# Altium footprint library Apalis Evaluation Board.PcbLib: 212 footprints (part 7 of 14)
Each footprint in its own frame and in the unit in brackets; x right, y up, seen from the top. Pads: shape width x height; smd on the part's side, far side on the other; paste and mask are expansions set on the pad; w line width, h text height; cw(c..) or ccw(c..) is an arc to the next point about the centre after c.
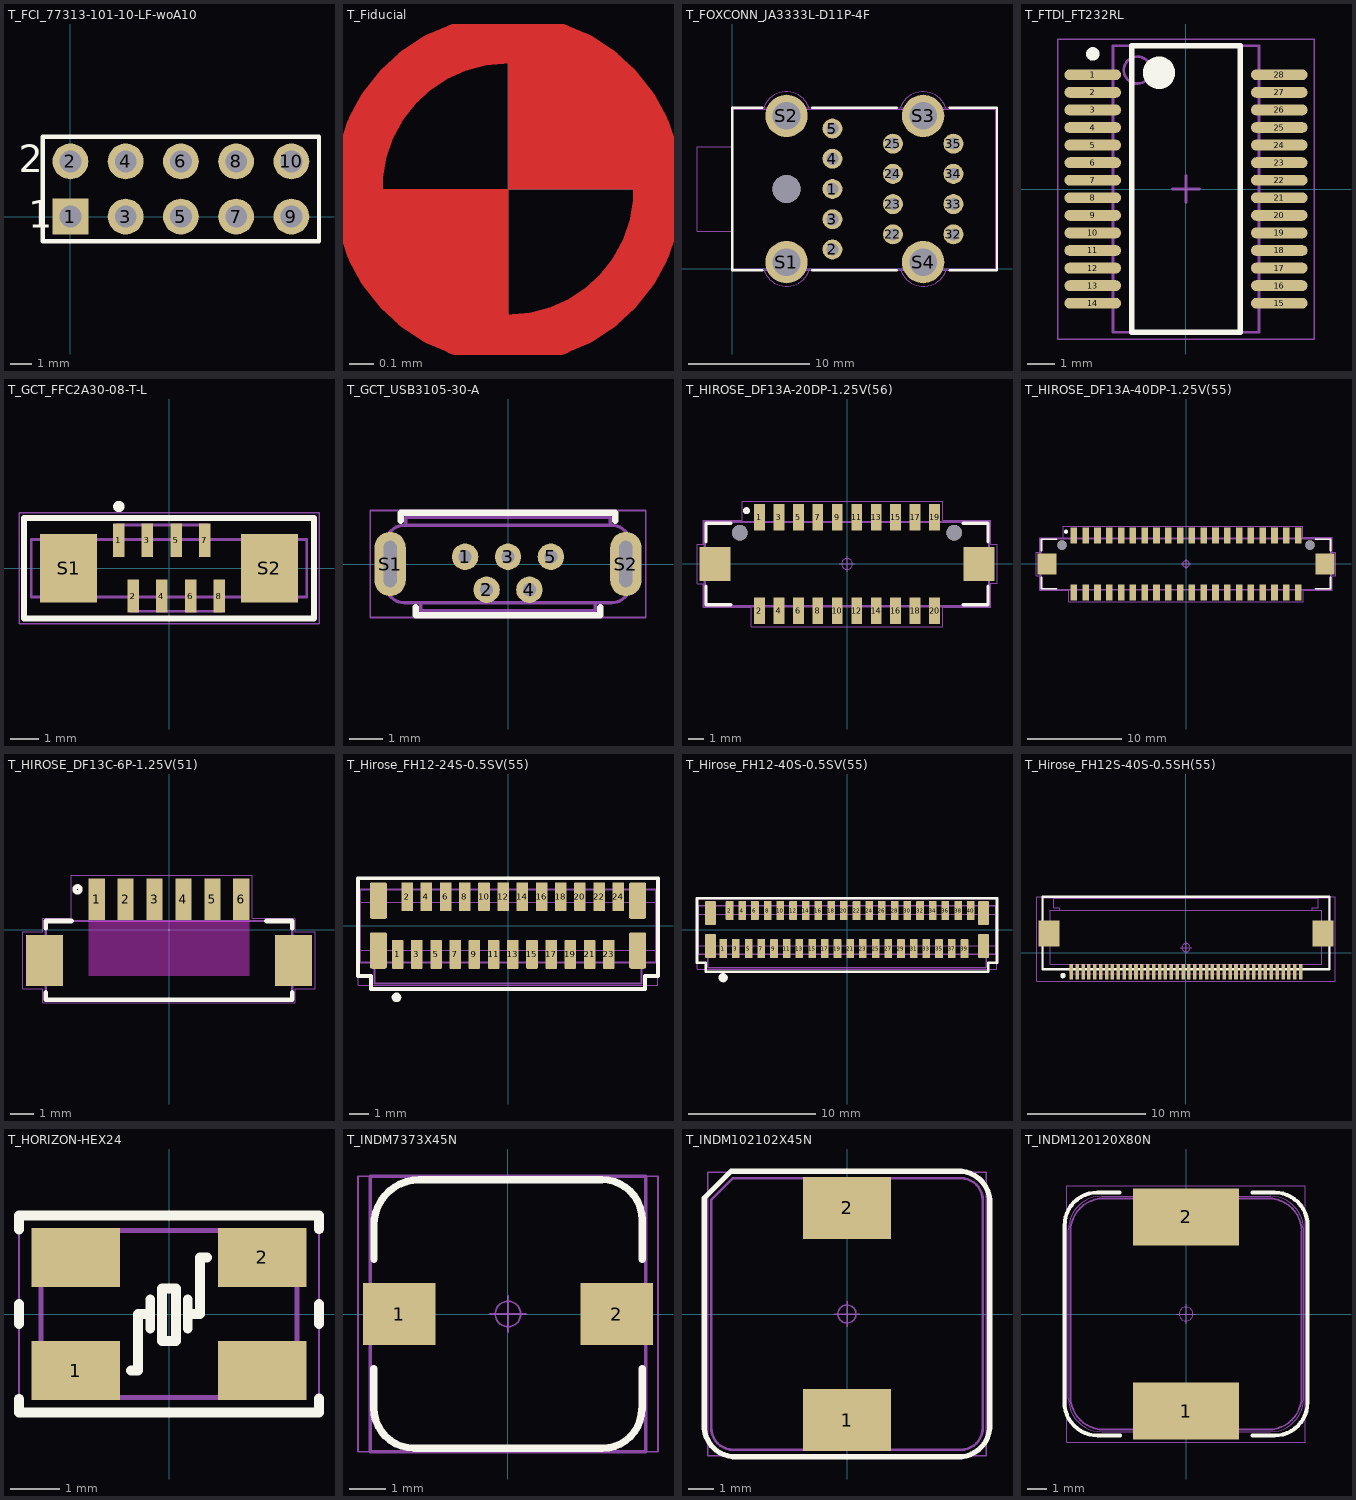
[diagram p6: the footprints below, top view; thin cyan lines are the x and y axes]

## T_FCI_77313-101-10-LF-woA10 [mm] "2.54 mm header"
height 10.8
pads (10):
  rect 1.65x1.65 hole 1: 1(0,0)
  round 1.65 hole 1: 2(0,2.54) 3(2.54,0) 4(2.54,2.54) 5(5.08,0) 6(5.08,2.54) 7(7.62,0) 8(7.62,2.54) 9(10.16,0) 10(10.16,2.54)
Top Overlay:
  lines w0.2: -1.27,-1.14 11.43,-1.14 ; -1.27,-1.137 -1.27,3.68 11.43,3.68 11.43,-1.137
  text "2" at -2.364,2.048 h1.27
  text "1" at -1.941,-0.522 h1.27
Mechanical 1:
  lines w0.05: -1.27,-1.14 11.43,-1.14 ; -1.27,-1.137 -1.27,3.68 11.43,3.68 11.43,-1.137
Mechanical 2:
  lines w0.001: -1.27,-1.14 11.43,-1.14 11.43,3.68 -1.27,3.68 -1.27,-1.14
Mechanical 3:
  lines w0.1: -1.27,-1.14 11.43,-1.14 ; -1.27,-1.137 -1.27,3.68 11.43,3.68 11.43,-1.137

## T_Fiducial [mm] "Fiducial"
Top Layer:
  region: 0,-0.625 -0.375,-0.5 -0.625,-0.25 -0.625,0 0,0
  region: 0.625,0 0,0 0,0.625 0.375,0.5 0.625,0.25
  lines w0.203: 0,-0.625 ccw(c0,0) 0,0.625 ccw(c0,0) 0,-0.625
Top Solder:
  circle w0.203: c0,0 r0.625
  region: 0.625,0 0.5,-0.375 0.25,-0.625 -0.25,-0.625 -0.5,-0.375 -0.625,0 -0.5,0.375 -0.375,0.5 0,0.625 0.375,0.5 0.5,0.25 0.5,0.375 0.375,0.5

## T_FOXCONN_JA3333L-D11P-4F [mm] "Audio Jack Triple Stacked DIP Type With Sense"
height 35.5
pads (18):
  round 1.65 hole 1: 1(8.3,6.6) 2(8.3,1.6) 3(8.3,4.1) 4(8.3,9.1) 5(8.3,11.6) 22(13.3,2.85) 23(13.3,5.35) 24(13.3,7.85) 25(13.3,10.35) 32(18.3,2.85) 33(18.3,5.35) 34(18.3,7.85) 35(18.3,10.35)
  round 3.5 hole 2.3: S1(4.5,0.55) S2(4.5,12.65) S3(15.8,12.65) S4(15.8,0.55)
  round 2.3 hole 2.3 unplated: ""(4.5,6.6)
Top Overlay:
  lines w0.2: 0,-0.105 2.5,-0.105 ; 0,-0.082 0,13.305 2.5,13.305 ; 6.625,-0.105 13.625,-0.105 ; 6.625,13.305 13.625,13.305 ; 18,-0.105 21.903,-0.105 21.905,-0.105 21.905,13.305 18,13.305
Mechanical 1:
  lines w0.05: 2.604,13.299 cw(c4.484,12.666) 6.363,13.301 ; 2.604,13.3 0,13.3 0,-0.1 2.637,-0.1 ; 2.637,-0.101 ccw(c4.516,0.533) 6.396,-0.099 ; 6.363,13.3 13.904,13.3 ; 6.396,-0.1 13.937,-0.1 ; 13.904,13.299 cw(c15.784,12.666) 17.663,13.301 ; 13.937,-0.101 ccw(c15.816,0.533) 17.696,-0.099 ; 17.663,13.3 21.9,13.3 21.9,-0.1 17.696,-0.1
Mechanical 2:
  lines w0.001: 0,3.1 -2.9,3.1 -2.9,10.1 0,10.1 ; 0,0 0,13.2 21.8,13.2 21.8,0 0,0
Mechanical 3:
  lines w0.1: 0,-0.1 21.901,-0.1 ; 0,13.3 21.9,13.3 21.902,13.298 21.902,-0.1 ; 0.001,-0.074 0.001,13.326 ; 21.901,-0.1 21.902,-0.1
3D body: height 31.5, standoff 28.5, extent -2.905,5.105 0.01,8.093
3D body: height 19, standoff 16, extent -2.905,5.105 0.01,8.093
3D body: height 6.5, standoff 3.5, extent -2.905,5.105 0.01,8.093
3D body: height 21.01, standoff 13.99, extent -2.9,3.1 0,10.1
3D body: height 33.51, standoff 26.49, extent -2.9,3.1 0,10.1
3D body: height 8.51, standoff 1.49, extent -2.9,3.1 0,10.1
3D body: height 38.5, standoff 0, extent 0,0 21.8,13.2

## T_FTDI_FT232RL [mm] "28-Pin SSOP 0.65 mm Pitch"
height 2
pads (28):
  oval 2.1x0.4 smd: 1(-3.45,4.225) 2(-3.45,3.575) 3(-3.45,2.925) 4(-3.45,2.275) 5(-3.45,1.625) 6(-3.45,0.975) 7(-3.45,0.325) 8(-3.45,-0.325) 9(-3.45,-0.975) 10(-3.45,-1.625) 11(-3.45,-2.275) 12(-3.45,-2.925) 13(-3.45,-3.575) 14(-3.45,-4.225) 15(3.45,-4.225) 16(3.45,-3.575) 17(3.45,-2.925) 18(3.45,-2.275) 19(3.45,-1.625) 20(3.45,-0.975) 21(3.45,-0.325) 22(3.45,0.325) 23(3.45,0.975) 24(3.45,1.625) 25(3.45,2.275) 26(3.45,2.925) 27(3.45,3.575) 28(3.45,4.225)
Top Overlay:
  circle w0.6: c-1,4.3 r0.3
  circle w0.25: c-3.45,5 r0.125
  lines w0.2: -2,-5.3 2,-5.3 2,5.3 -2,5.3 -2,-5.3
Mechanical 1:
  lines w0.05: -4.75,-5.55 -4.75,5.55 4.75,5.55 4.75,-5.55 -4.75,-5.55
  lines w0.1: -0.5,0 0.5,0 ; 0,-0.5 0,0.5
Mechanical 2:
  lines w0.001: -2.7,-5.3 2.7,-5.3 2.7,5.3 -2.7,5.3 -2.7,-5.3
Mechanical 3:
  circle w0.1: c-1.8,4.4 r0.5
  lines w0.1: -2.7,-5.3 -2.7,5.3 2.7,5.3 2.7,-5.3 -2.7,-5.3
3D body: height 2, standoff 0, extent -2.7,-5.3 2.7,5.3

## T_GCT_FFC2A30-08-T-L [mm] "JTAG FFC Connector 0.5mm pitch vertical"
height 5.4
pads (10):
  rect 0.4x1.15 smd: 1(-1.75,0.975) 2(-1.25,-0.975) 3(-0.75,0.975) 4(-0.25,-0.975) 5(0.25,0.975) 6(0.75,-0.975) 7(1.25,0.975) 8(1.75,-0.975)
  rect 2x2.4 smd: S1(-3.5,0) S2(3.5,0)
Top Overlay:
  circle w0.254: c-1.75,2.15 r0.071
  lines w0.2: -5.05,-1.75 -5.05,1.75 5.05,1.75 5.05,-1.75 -5.05,-1.75
Mechanical 1:
  lines w0.05: -5.225,-1.925 -5.225,1.925 5.225,1.925 5.225,-1.925 -5.225,-1.925
Mechanical 2:
  lines w0.001: -4.25,-1 -4.25,1 ; -1.85,1 -1.85,1.5 1.35,1.5 1.35,1 ; -1.35,-1 -1.35,-1.5 1.85,-1.5 1.85,-1 ; 4.25,-1 4.25,1 ; -4.8,-1 -4.8,1 4.8,1 4.8,-1 -4.8,-1
Mechanical 3:
  lines w0.1: -1.85,1 -1.85,1.5 1.35,1.5 1.35,1 ; -1.35,-1 -1.35,-1.5 1.85,-1.5 1.85,-1 ; -4.8,-1 4.8,-1 4.8,1 -4.8,1 -4.8,-1
3D body: height 4.4, standoff 2.5, extent -4.8,-1 4.8,1
3D body: height 2.5, standoff 0, extent -4.25,-1 4.25,1

## T_GCT_USB3105-30-A [mm] "Micro USB Connector Vertical"
height 5.6
pads (7):
  round 0.8 hole 0.4: 1(-1.3,0.22) 2(-0.65,-0.78) 3(0,0.22) 4(0.65,-0.78) 5(1.3,0.22)
  oval 0.95x1.95 hole 0.4 slot 1.4 at 90 deg: S1(-3.575,0) S2(3.575,0)
Top Overlay:
  lines w0.2: -3.25,1.32 -3.25,1.55 3.25,1.55 3.25,1.32 ; -2.8,-1.32 -2.8,-1.55 2.8,-1.55 2.8,-1.32
Mechanical 1:
  lines w0.05: -4.175,-1.625 -4.175,1.625 4.175,1.625 4.175,-1.625 -4.175,-1.625
Mechanical 2:
  lines w0.001: -3.7,-0.175 -3.945,-0.175 -3.945,0.625 -3.7,0.625 ; -3.1,1.175 -3.1,1.42 3.1,1.42 3.1,1.175 ; -2.65,-1.175 -2.65,-1.42 2.65,-1.42 2.65,-1.175 ; 3.15,1.175 cw(c3.15,0.625) 3.7,0.625 ; 3.175,1.175 -3.15,1.175 ccw(c-3.15,0.625) -3.7,0.625 ; 3.7,-0.175 3.945,-0.175 3.945,0.625 3.7,0.625 ; -3.7,0.625 -3.7,-0.625 ccw(c-3.15,-0.625) -3.15,-1.175 3.15,-1.175 ccw(c3.15,-0.625) 3.7,-0.625 3.7,0.625
Mechanical 3:
  lines w0.1: -3.7,-0.175 -3.945,-0.175 -3.945,0.625 -3.7,0.625 ; -3.1,1.175 -3.1,1.42 3.1,1.42 3.1,1.175 ; -2.65,-1.175 -2.65,-1.42 2.65,-1.42 2.65,-1.175 ; 3.15,1.175 cw(c3.15,0.625) 3.7,0.625 ; 3.175,1.175 -3.15,1.175 ccw(c-3.15,0.625) -3.7,0.625 ; 3.7,-0.175 3.945,-0.175 3.945,0.625 3.7,0.625 ; -3.7,0.625 -3.7,-0.625 ccw(c-3.15,-0.625) -3.15,-1.175 3.15,-1.175 ccw(c3.15,-0.625) 3.7,-0.625 3.7,0.625
3D body "USB3105.STEP": height 5.62, standoff -1.48, extent -3.98,-1.455 3.98,1.48

## T_HIROSE_DF13A-20DP-1.25V(56) [mm]
height 4.8
pads (24):
  rect 0.7x1.7 smd: 1(-5.625,3) 2(-5.625,-3) 3(-4.375,3) 4(-4.375,-3) 5(-3.125,3) 6(-3.125,-3) 7(-1.875,3) 8(-1.875,-3) 9(-0.625,3) 10(-0.625,-3) 11(0.625,3) 12(0.625,-3) 13(1.875,3) 14(1.875,-3) 15(3.125,3) 16(3.125,-3) 17(4.375,3) 18(4.375,-3) 19(5.625,3) 20(5.625,-3)
  rect 2x2.2 smd: ""(-8.475,0) ""(8.475,0)
  round 1 hole 1 unplated paste+0 mask+0: ""(-6.875,2) ""(6.875,2)
Top Overlay:
  circle w0.2: c-6.455,3.42 r0.125
  lines w0.2: -9.04,-1.42 -9.04,-2.62 -7.463,-2.62 ; -9.04,1.41 -9.04,2.61 -7.463,2.61 ; 7.463,-2.62 9.04,-2.62 9.04,-1.42 ; 7.463,2.61 9.04,2.61 9.04,1.41
Mechanical 1:
  circle w0.05: c0,0 r0.35
  lines w0.05: -0.5,0 0.5,0 ; 0,-0.5 0,0.5 ; 9.222,1.255 9.222,2.804 8.052,2.804 6.136,2.804 6.136,4.01 -6.726,4.01 -6.726,2.796 -9.216,2.796 -9.216,1.652 -9.216,1.252 -9.63,1.252 -9.63,-1.258 -9.218,-1.258 -9.218,-2.796 -6.142,-2.796 -6.142,-4.02 6.143,-4.02 6.143,-2.796 9.221,-2.796 9.221,-1.248 9.63,-1.248 ; 9.224,1.255 9.63,1.255 9.63,-1.237
Mechanical 2:
  lines w0.001: -9.175,-2.75 -9.175,2.75 9.175,2.75 9.175,-2.75 -9.175,-2.75
Mechanical 3:
  lines w0.1: -9.1,-2.68 -9.1,2.67 9.1,2.67 9.1,-2.68 -9.1,-2.68
3D body "DF13A-20DP-1.25V.stp": height 4.8, standoff 0, extent -9.175,-3.45 9.175,3.45

## T_HIROSE_DF13A-40DP-1.25V(55) [mm]
height 4.8
pads (44):
  rect 0.7x1.7 smd: 1(-11.875,3) 2(-11.875,-3) 3(-10.625,3) 4(-10.625,-3) 5(-9.375,3) 6(-9.375,-3) 7(-8.125,3) 8(-8.125,-3) 9(-6.875,3) 10(-6.875,-3) 11(-5.625,3) 12(-5.625,-3) 13(-4.375,3) 14(-4.375,-3) 15(-3.125,3) 16(-3.125,-3) 17(-1.875,3) 18(-1.875,-3) 19(-0.625,3) 20(-0.625,-3) 21(0.625,3) 22(0.625,-3) 23(1.875,3) 24(1.875,-3) 25(3.125,3) 26(3.125,-3) 27(4.375,3) 28(4.375,-3) 29(5.625,3) 30(5.625,-3) 31(6.875,3) 32(6.875,-3) 33(8.125,3) 34(8.125,-3) 35(9.375,3) 36(9.375,-3) 37(10.625,3) 38(10.625,-3) 39(11.875,3) 40(11.875,-3)
  rect 2x2.2 smd: ""(-14.725,0) ""(14.725,0)
  round 1 hole 1 unplated paste+0 mask+0: ""(-13.125,2) ""(13.125,2)
Top Overlay:
  circle w0.2: c-12.705,3.42 r0.125
  lines w0.2: -15.29,-1.42 -15.29,-2.62 -13.713,-2.62 ; -15.29,1.41 -15.29,2.61 -13.713,2.61 ; 13.713,-2.62 15.29,-2.62 15.29,-1.42 ; 13.713,2.61 15.29,2.61 15.29,1.41
Mechanical 1:
  circle w0.05: c0,0 r0.35
  lines w0.05: -0.5,0 0.5,0 ; 0,-0.5 0,0.5 ; 15.472,1.255 15.472,2.804 14.302,2.804 12.386,2.804 12.386,4.01 -12.976,4.01 -12.976,2.796 -15.466,2.796 -15.466,1.652 -15.466,1.252 -15.88,1.252 -15.88,-1.258 -15.468,-1.258 -15.468,-2.796 -12.392,-2.796 -12.392,-4.02 12.393,-4.02 12.393,-2.796 15.471,-2.796 15.471,-1.248 15.88,-1.248 ; 15.474,1.255 15.88,1.255 15.88,-1.237
Mechanical 2:
  lines w0.001: -15.425,-2.75 -15.425,2.75 15.425,2.75 15.425,-2.75 -15.425,-2.75
Mechanical 3:
  lines w0.1: -15.35,-2.68 -15.35,2.67 15.35,2.67 15.35,-2.68 -15.35,-2.68
3D body "DF13A-40DP-1.25V.stp": height 4.82, standoff 0.02, extent -15.425,-3.45 15.425,3.45

## T_HIROSE_DF13C-6P-1.25V(51) [mm] "Touch connector"
height 4.8
pads (8):
  rect 0.7x1.8 smd: 1(-3.125,1.324) 2(-1.875,1.324) 3(-0.625,1.324) 4(0.625,1.324) 5(1.875,1.324) 6(3.125,1.324)
  rect 1.6x2.2 smd: ""(-5.385,-1.324) ""(5.385,-1.324)
Top Overlay:
  circle w0.2: c-3.955,1.744 r0.125
  lines w0.2: -5.325,-2.713 -5.325,-3.024 5.325,-3.024 5.325,-2.713 ; -5.325,0.064 -5.325,0.376 -4.201,0.376 ; 4.201,0.376 5.325,0.376 5.325,0.064
Keep-Out Layer:
  rectangle: -3.475,-1.994 3.475,0.376
Mechanical 1:
  lines w0.05: -6.316,-2.555 -6.316,-0.093 -5.456,-0.093 -5.456,0.506 -4.226,0.506 -4.226,2.354 3.606,2.354 3.606,0.507 5.456,0.507 5.456,-0.092 6.316,-0.093 6.316,-2.555 5.456,-2.555 5.456,-3.155 -5.456,-3.155 -5.456,-2.555 -6.316,-2.555
Mechanical 2:
  lines w0.001: -5.325,-2.224 -6.075,-2.224 -6.075,-0.424 -5.325,-0.424 ; 5.325,-2.224 6.075,-2.224 6.075,-0.424 5.325,-0.424 ; -5.325,-3.024 -5.325,0.376 5.325,0.376 5.325,-3.024 -5.325,-3.024
Mechanical 3:
  lines w0.1: -5.325,-3.024 -5.325,0.376 5.325,0.376 5.325,-3.024 -5.325,-3.024

## T_Hirose_FH12-24S-0.5SV(55) [mm] "FFC Connector 0.5mm pitch Vertical"
height 5.5
pads (28):
  rrect12% 0.6x1.5 smd: 1(-5.75,-1.5) 2(-5.25,1.5) 3(-4.75,-1.5) 4(-4.25,1.5) 5(-3.75,-1.5) 6(-3.25,1.5) 7(-2.75,-1.5) 8(-2.25,1.5) 9(-1.75,-1.5) 10(-1.25,1.5) 11(-0.75,-1.5) 12(-0.25,1.5) 13(0.25,-1.5) 14(0.75,1.5) 15(1.25,-1.5) 16(1.75,1.5) 17(2.25,-1.5) 18(2.75,1.5) 19(3.25,-1.5) 20(3.75,1.5) 21(4.25,-1.5) 22(4.75,1.5) 23(5.25,-1.5) 24(5.75,1.5)
  rrect25% 0.9x1.9 smd: ""(-6.75,-1.3) ""(-6.75,1.3) ""(6.75,-1.3) ""(6.75,1.3)
Top Overlay:
  circle w0.25: c-5.81,-3.738 r0.125
  lines w0.2: -7.814,-2.625 -7.814,2.464 7.814,2.464 7.814,-2.625 7.132,-2.625 7.132,-3.307 -7.132,-3.307 -7.132,-2.625 -7.814,-2.625
Mechanical 1:
  lines w0.05: -7.8,-3.116 7.8,-3.116 7.8,2.416 -7.8,2.416 -7.8,-3.116
Mechanical 2:
  lines w0.001: -7.7,-1.275 7.7,-1.275 ; -7.7,1.225 7.7,1.225 ; -6.95,-1.925 -6.95,-3.025 6.95,-3.025 6.95,-1.925 ; -7.7,-1.925 7.7,-1.925 7.7,1.875 -7.7,1.875 -7.7,-1.925
Mechanical 3:
  lines w0.1: -6.95,-1.925 -6.95,-3.025 6.95,-3.025 6.95,-1.925 ; -7.7,-1.925 7.7,-1.925 7.7,1.875 -7.7,1.875 -7.7,-1.925
3D body "FH12-24S-0.5SV.stp": height 5.52, standoff 0.02, extent -7.7,-1.925 7.7,1.875

## T_Hirose_FH12-40S-0.5SV(55) [mm] "FFC Connector 0.5mm pitch Vertical"
height 5.5
pads (44):
  rrect12% 0.6x1.5 smd: 1(-9.75,-1.5) 2(-9.25,1.5) 3(-8.75,-1.5) 4(-8.25,1.5) 5(-7.75,-1.5) 6(-7.25,1.5) 7(-6.75,-1.5) 8(-6.25,1.5) 9(-5.75,-1.5) 10(-5.25,1.5) 11(-4.75,-1.5) 12(-4.25,1.5) 13(-3.75,-1.5) 14(-3.25,1.5) 15(-2.75,-1.5) 16(-2.25,1.5) 17(-1.75,-1.5) 18(-1.25,1.5) 19(-0.75,-1.5) 20(-0.25,1.5) 21(0.25,-1.5) 22(0.75,1.5) 23(1.25,-1.5) 24(1.75,1.5) 25(2.25,-1.5) 26(2.75,1.5) 27(3.25,-1.5) 28(3.75,1.5) 29(4.25,-1.5) 30(4.75,1.5) 31(5.25,-1.5) 32(5.75,1.5) 33(6.25,-1.5) 34(6.75,1.5) 35(7.25,-1.5) 36(7.75,1.5) 37(8.25,-1.5) 38(8.75,1.5) 39(9.25,-1.5) 40(9.75,1.5)
  rrect25% 0.9x1.9 smd: ""(-10.75,-1.3) ""(-10.75,1.3) ""(10.75,-1.3) ""(10.75,1.3)
Top Overlay:
  circle w0.4: c-9.75,-3.79 r0.16
  lines w0.2: 11.13,-3.307 -11.132,-3.307 -11.132,-2.625 -11.814,-2.625 -11.814,2.464 11.814,2.464 11.814,-2.625 11.132,-2.625 11.132,-3.307
Mechanical 1:
  lines w0.05: -11.8,-3.116 -11.8,2.416 11.8,2.416 11.8,-3.116 -11.8,-3.116
Mechanical 2:
  lines w0.001: -11.7,-1.275 11.7,-1.275 ; -11.7,1.225 11.7,1.225 ; -10.95,-1.925 -10.95,-3.025 10.95,-3.025 10.95,-1.925 ; -11.7,-1.925 -11.7,1.875 11.7,1.875 11.7,-1.925 -11.7,-1.925
Mechanical 3:
  lines w0.1: -10.95,-1.925 -10.95,-3.025 10.95,-3.025 10.95,-1.925 ; -11.7,-1.925 -11.7,1.875 11.7,1.875 11.7,-1.925 -11.7,-1.925
3D body "FH12-40S-0.5SV.stp": height 5.52, standoff 0.02, extent -11.7,-1.925 11.7,1.875

## T_Hirose_FH12S-40S-0.5SH(55) [mm] "DVI FFC Connector 0.5mm pitch"
height 2
pads (42):
  rect 0.3x1.3 smd: 1(-9.75,-1.625) 2(-9.25,-1.625) 3(-8.75,-1.625) 4(-8.25,-1.625) 5(-7.75,-1.625) 6(-7.25,-1.625) 7(-6.75,-1.625) 8(-6.25,-1.625) 9(-5.75,-1.625) 10(-5.25,-1.625) 11(-4.75,-1.625) 12(-4.25,-1.625) 13(-3.75,-1.625) 14(-3.25,-1.625) 15(-2.75,-1.625) 16(-2.25,-1.625) 17(-1.75,-1.625) 18(-1.25,-1.625) 19(-0.75,-1.625) 20(-0.25,-1.625) 21(0.25,-1.625) 22(0.75,-1.625) 23(1.25,-1.625) 24(1.75,-1.625) 25(2.25,-1.625) 26(2.75,-1.625) 27(3.25,-1.625) 28(3.75,-1.625) 29(4.25,-1.625) 30(4.75,-1.625) 31(5.25,-1.625) 32(5.75,-1.625) 33(6.25,-1.625) 34(6.75,-1.625) 35(7.25,-1.625) 36(7.75,-1.625) 37(8.25,-1.625) 38(8.75,-1.625) 39(9.25,-1.625) 40(9.75,-1.625)
  rect 1.8x2.2 smd: ""(-11.65,1.625) ""(11.65,1.625)
Top Overlay:
  circle w0.2: c-10.459,-1.944 r0.125
  lines w0.2: -12.198,-1.411 -12.198,4.755 12.193,4.755 12.193,-1.411 -12.198,-1.411
Mechanical 1:
  circle w0.05: c0,0.425 r0.35
  lines w0.05: -0.5,0.425 0.5,0.425 ; 0,-0.075 0,0.925 ; -12.69,-2.415 -12.69,4.755 12.69,4.755 12.69,-2.415 -12.69,-2.415
Mechanical 2:
  lines w0.001: -10.75,3.625 -10.75,3.825 -11.25,3.825 -11.25,4.625 11.25,4.625 11.25,3.825 10.75,3.825 10.75,3.625 ; -9.85,-0.975 -9.85,-1.775 9.85,-1.775 9.85,-0.975 ; -12.05,1.025 -12.05,2.225 -11.55,2.225 -11.55,3.625 11.55,3.625 11.55,2.225 12.05,2.225 12.05,1.025 11.55,1.025 11.55,-0.975 -11.55,-0.975 -11.55,1.025 -12.05,1.025
Mechanical 3:
  lines w0.1: -12.125,-1.336 -12.125,4.689 12.12,4.689 12.12,-1.336 -12.125,-1.336

## T_HORIZON-HEX24 [mm] "OSC"
height 0.9
pads (4):
  rect 1.8x1.2 smd: 1(-1.9,-1.15) 2(1.9,1.15) ""(-1.9,1.15) ""(1.9,-1.15)
Top Overlay:
  lines w0.2: -3.05,-1.722 -3.05,-2.001 3.05,-2.001 ; -3.05,-0.2 -3.05,0.2 ; -3.05,1.72 -3.05,1.999 ; -3.05,2.001 3.05,2.001 3.05,1.722 ; -0.77,-1.15 -0.63,-1.15 -0.63,0 -0.38,0 ; -0.38,-0.3 -0.38,0.3 ; 0.38,-0.3 0.38,0.3 ; 0.38,0 0.63,0 0.63,1.15 0.77,1.15 ; 3.05,-1.999 3.05,-1.72 ; 3.05,-0.2 3.05,0.2 ; -0.14,-0.55 0.14,-0.55 0.14,0.52 -0.14,0.52 -0.14,-0.55
Mechanical 1:
  lines w0.05: -3.05,-2.001 -3.05,2.001 3.05,2.001 3.05,-2.001 -3.05,-2.001
Mechanical 2:
  lines w0.001: -2.6,-1.7 -2.6,1.7 2.6,1.7 2.6,-1.7 -2.6,-1.7
Mechanical 3:
  lines w0.1: -2.6,-1.7 -2.6,1.7 2.6,1.7 2.6,-1.7 -2.6,-1.7
3D body: height 0.9, standoff 0, extent -2.6,-1.7 2.6,1.7

## T_INDM7373X45N [mm]
height 4.5
pads (2):
  rect 2x1.7 smd: 1(-3,0) 2(3,0)
Top Overlay:
  lines w0.2: -3.7,-1.5 -3.7,-2.59 ccw(c-2.594,-2.59) -2.594,-3.697 ; -3.696,1.5 -3.696,2.6 ; -3.696,2.452 cw(c-2.448,2.452) -2.448,3.7 2.588,3.7 ; -2.594,-3.7 2.609,-3.7 ccw(c2.609,-2.623) 3.686,-2.623 ; 2.588,3.708 cw(c2.588,2.596) 3.7,2.596 ; 3.7,-2.623 3.7,-1.5 ; 3.7,1.5 3.7,2.6
Mechanical 1:
  circle w0.05: c0,0 r0.35
  lines w0.05: -0.5,0 0.5,0 ; 0,-0.5 0,0.5 ; -4.135,-3.8 -4.135,3.8 4.136,3.8 4.136,-3.8 -4.135,-3.8
Mechanical 2:
  lines w0.001: -3.8,-3.8 -3.8,3.8 3.8,3.8 3.8,-3.8 -3.8,-3.8
Mechanical 3:
  lines w0.1: -3.8,-3.8 -3.8,3.8 3.8,3.8 3.8,-3.8 -3.8,-3.8

## T_INDM102102X45N [mm]
height 4.5
pads (2):
  rect 3.4x2.4 smd: 1(0,-4.1) 2(0,4.1)
Top Overlay:
  lines w0.2: 4.24,-5.52 ccw(c4.32,-4.32) 5.52,-4.4 5.52,4.4 ; 4.4,-5.52 -4.4,-5.52 cw(c-4.32,-4.32) -5.52,-4.24 -5.52,4.49 -4.49,5.52 4.24,5.52 cw(c4.32,4.32) 5.52,4.24
Mechanical 1:
  circle w0.05: c0,0 r0.35
  lines w0.05: -0.5,0 0.5,0 ; 0,-0.5 0,0.5 ; -5.38,-5.48 5.38,-5.48 5.38,5.48 -5.38,5.48 -5.38,-5.48
Mechanical 2:
  lines w0.001: -5.25,-4.4 ccw(c-4.4,-4.4) -4.4,-5.25 4.4,-5.25 ccw(c4.4,-4.4) 5.25,-4.4 5.25,4.4 ccw(c4.4,4.4) 4.4,5.25 -4.4,5.25 -5.25,4.4 -5.25,-4.4
Mechanical 3:
  lines w0.1: -5.25,-4.4 ccw(c-4.4,-4.4) -4.4,-5.25 4.4,-5.25 ccw(c4.4,-4.4) 5.25,-4.4 5.25,4.4 ccw(c4.4,4.4) 4.4,5.25 -4.4,5.25 -5.25,4.4 -5.25,-4.4
3D body: height 4.5, standoff 0, extent -5.25,-5.25 5.25,5.25

## T_INDM120120X80N [mm]
height 6
pads (2):
  rect 5.4x2.9 smd: 1(0,-4.95) 2(0,4.95)
Top Overlay:
  lines w0.2: -6.204,-4.492 ccw(c-4.496,-4.492) -4.496,-6.2 -3.373,-6.2 ; -6.2,-4.492 -6.2,4.516 ; -6.196,4.516 cw(c-4.513,4.516) -4.513,6.2 -3.39,6.2 ; 3.382,-6.2 4.505,-6.2 ccw(c4.505,-4.509) 6.196,-4.509 ; 3.393,6.196 4.516,6.196 cw(c4.516,4.512) 6.2,4.512 6.2,-4.509
Mechanical 1:
  circle w0.05: c0,0 r0.35
  lines w0.05: -0.5,0 0.5,0 ; 0,-0.5 0,0.5 ; -6.08,-6.535 6.08,-6.535 6.08,6.535 -6.08,6.535 -6.08,-6.535
Mechanical 2:
  lines w0.001: -6,-4.299 ccw(c-4.299,-4.299) -4.3,-6 ; -6,4.3 cw(c-4.299,4.299) -4.299,6 ; -6,-4.302 -6,4.303 ; -4.303,6 4.322,6 ; -4.302,-6 4.304,-6 ; 4.299,-6 ccw(c4.299,-4.299) 6,-4.3 ; 4.3,6 cw(c4.299,4.299) 6,4.299 ; 6,-4.313 6,4.322
Mechanical 3:
  lines w0.1: -5.901,-4.198 ccw(c-4.2,-4.198) -4.201,-5.899 ; -5.9,-4.21 -5.9,4.2 ; -5.899,4.201 cw(c-4.198,4.2) -4.198,5.901 ; -4.21,-5.9 4.21,-5.9 ; -4.2,5.9 4.2,5.9 ; 4.198,-5.901 ccw(c4.198,-4.2) 5.899,-4.201 ; 4.201,5.899 cw(c4.2,4.198) 5.901,4.198 ; 5.9,-4.21 5.9,4.2
3D body: height 6, standoff 0, extent -6,-6 6,6